# Altium footprint library Footprints_SOC.PcbLib: 201 footprints (part 6 of 13)
Each footprint in its own frame and in the unit in brackets; x right, y up, seen from the top. Pads: shape width x height; smd on the part's side, far side on the other; paste and mask are expansions set on the pad; w line width, h text height; cw(c..) or ccw(c..) is an arc to the next point about the centre after c.
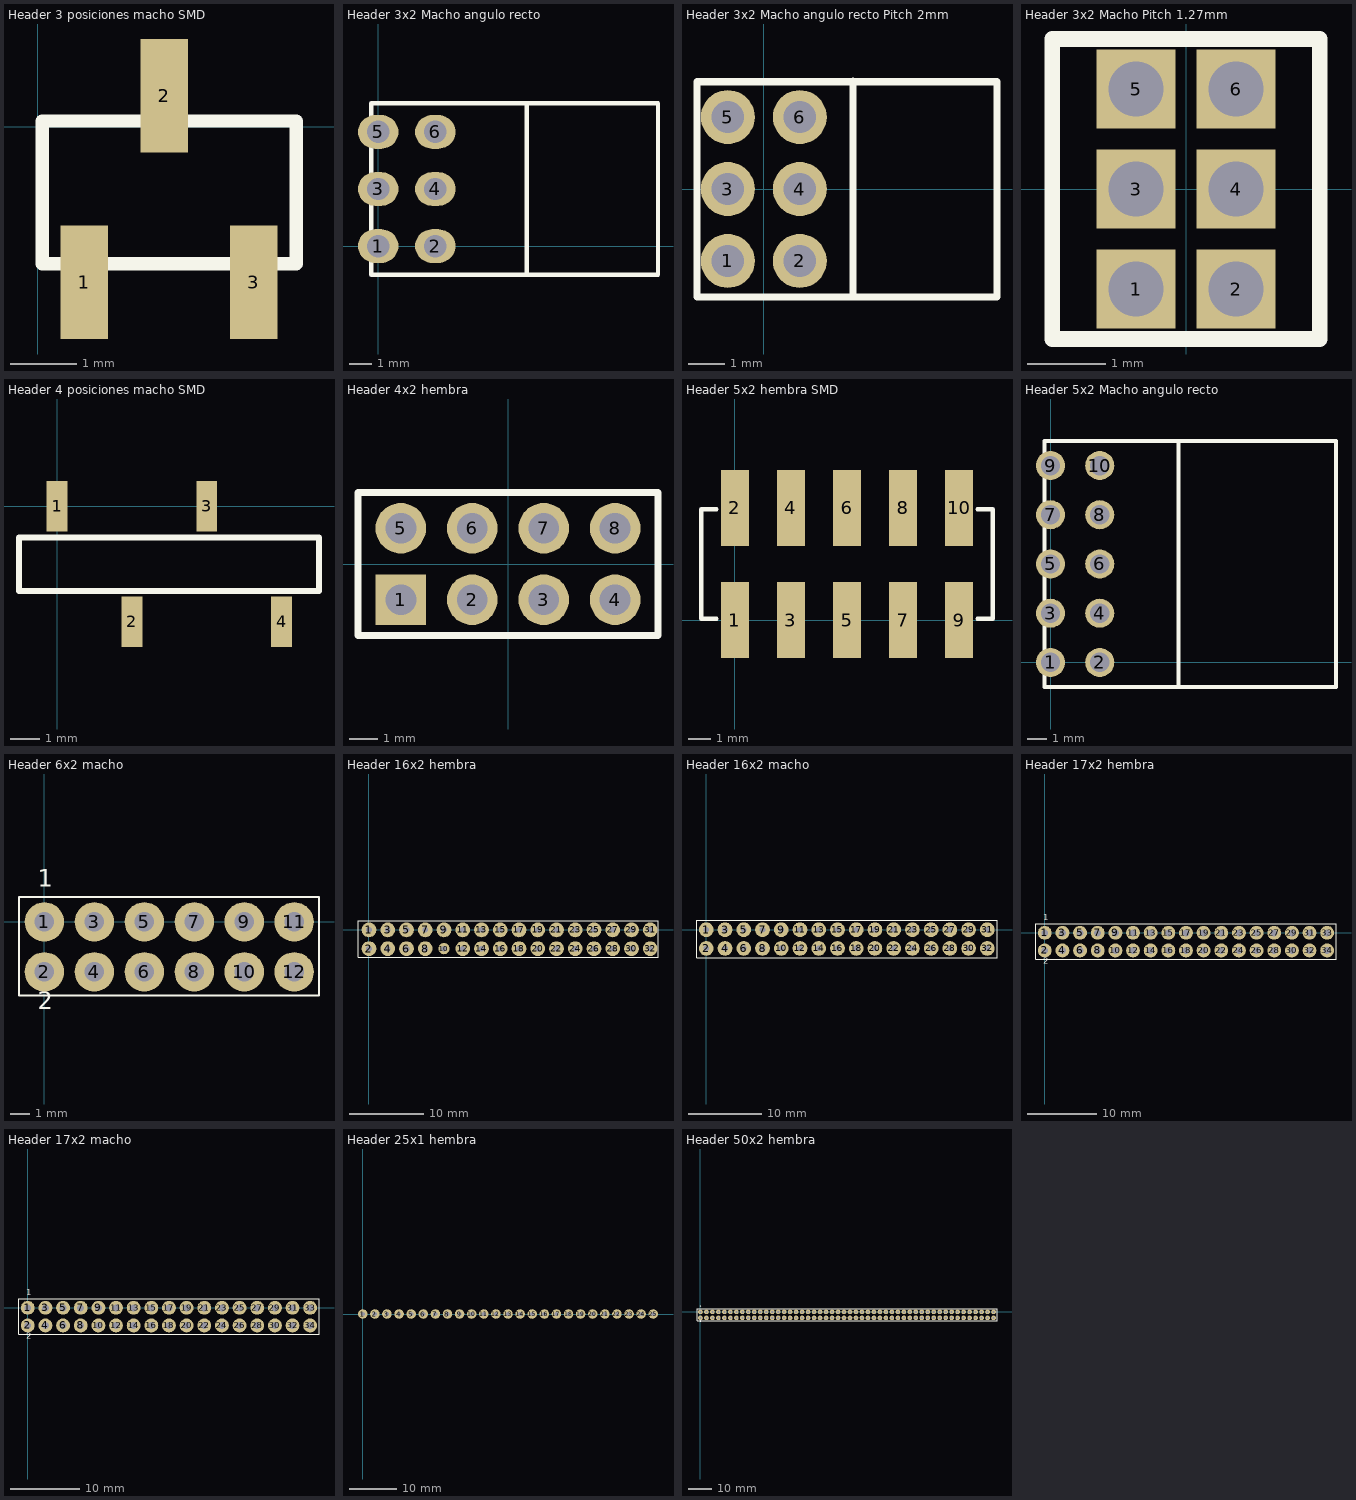
[diagram p5: the footprints below, top view; thin cyan lines are the x and y axes]

## Fibra Optica Panel [mm]
3D body: height 14.75, standoff 2.05, extent 0.833,0.49 11.833,11.487
3D body: height 4.1, standoff -2.05, extent 0.806,0.357 11.855,11.533
3D body: height -2.05, standoff -19.35, extent 0.838,0.533 11.838,11.533

## Header 3 posiciones macho SMD [mm] "Pitch 1.27mm"
pads (3):
  rect 0.71x1.7 smd: 1(0.7,-2.33) 2(1.9,0.47) 3(3.24,-2.33)
Top Overlay:
  lines w0.2: 0.07,-2.05 0.07,0.09 3.88,0.09 3.88,-2.05 0.07,-2.05

## Header 3x2 Macho angulo recto [mm] "P/N: TSW-103-08-F-D-RA"
pads (6):
  oval 1.8x1.5 hole 1: 1(0,0) 2(2.54,0) 3(0,2.54) 4(2.54,2.54) 5(0,5.08) 6(2.54,5.08)
Top Overlay:
  lines w0.2: 6.605,-1.27 6.605,6.35 ; -0.316,-1.27 12.447,-1.27 12.447,6.35 -0.316,6.35 -0.316,-1.27
3D body "Header 3x2 macho angulo recto (TSW-103-08-F-D-RA).stp": height 5.54, standoff -2.31, extent -0.316,-1.27 12.447,6.35

## Header 3x2 Macho angulo recto Pitch 2mm [mm] "P/N: 0877600616"
pads (6):
  round 1.5 hole 0.9: 1(-1,-2) 2(1,-2) 3(-1,0) 4(1,0) 5(-1,2) 6(1,2)
Top Overlay:
  lines w0.2: 2.48,-3 2.48,3 ; -1.856,-3 -1.856,2.98 6.48,2.98 6.48,-3 -1.856,-3
3D body "Header 3x2 angulo recto pitch 2mm (877600616).stp": height 5.15, standoff -1.75, extent -1.52,-3 6.48,3

## Header 3x2 Macho Pitch 1.27mm [mm] "P/N: GRPB032VWVN-RC"
pads (6):
  rect 1x1 hole 0.7: 1(-0.635,-1.27) 2(0.635,-1.27) 3(-0.635,0) 4(0.635,0) 5(-0.635,1.27) 6(0.635,1.27)
Top Overlay:
  lines w0.2: -1.7,-1.905 1.7,-1.905 1.7,1.905 -1.7,1.905 -1.7,-1.905
3D body "Header 3x2 macho pitch 1.27mm.step": height 4.05, standoff -2.25, extent -1.7,-1.905 1.7,1.905

## Header 4 posiciones macho SMD [mm] "Pitch 2.54mm"
pads (4):
  rect 0.71x1.7 smd: 1(0,0) 2(2.54,-3.92) 3(5.08,0) 4(7.62,-3.92)
Top Overlay:
  lines w0.2: -1.29,-2.87 -1.29,-1.06 8.89,-1.06 8.89,-2.87 -1.29,-2.87
3D body "Header 4 posiciones macho SMD.stp": height 8.38, standoff -1.27, extent -1.27,-4.603 8.89,0.68

## Header 4x2 hembra [mm] "Pitch 2.54mm"
pads (8):
  rect 1.8x1.8 hole 1.1: 1(-3.81,-1.27)
  round 1.8 hole 1.1: 2(-1.27,-1.27) 3(1.27,-1.27) 4(3.81,-1.27) 5(-3.81,1.27) 6(-1.27,1.27) 7(1.27,1.27) 8(3.81,1.27)
Top Overlay:
  lines w0.254: -5.33,-2.54 -5.33,2.54 5.33,2.54 5.33,-2.54 -5.33,-2.54
3D body "Header 4x2 hembra pitch 2.54mm .STEP": height 8.5, standoff -3.2, extent -5.33,-2.54 5.33,2.54

## Header 5x2 hembra SMD [mm] "Pitch 2.54mm P/N: SSW-105-22-G-D-VS"
pads (10):
  rect 1.27x3.43 smd: 1(0,0) 2(0,5.08) 3(2.54,0) 4(2.54,5.08) 5(5.08,0) 6(5.08,5.08) 7(7.62,0) 8(7.62,5.08) 9(10.16,0) 10(10.16,5.08)
Top Overlay:
  lines w0.2: -0.832,0.063 -1.524,0.063 -1.524,5.016 -0.832,5.016 ; 10.992,0.063 11.684,0.063 11.684,5.016 10.992,5.016
3D body "Header 5x2 hembra smd (SSW-105-22-G-D-VS).stp": height 9.51, standoff -0.27, extent -1.524,-1.397 11.684,6.477

## Header 5x2 Macho angulo recto [mm] "P/N: TSW-105-25-L-D-RA"
pads (10):
  round 1.5 hole 1: 1(0,0) 2(2.54,0) 3(0,2.54) 4(2.54,2.54) 5(0,5.08) 6(2.54,5.08) 7(0,7.62) 8(2.54,7.62) 9(0,10.16) 10(2.54,10.16)
Top Overlay:
  lines w0.2: 6.605,-1.27 6.605,11.43 ; -0.316,-1.27 -0.316,11.43 14.733,11.43 14.733,-1.27 -0.316,-1.27
3D body "header macho angulo recto 5x2 (TSW-105-25-L-D-RA).stp": height 5.54, standoff -2.56, extent -0.316,-1.27 14.733,11.43

## Header 6x2 macho [mm]
pads (12):
  round 2 hole 1: 1(0,0) 2(0,-2.54) 3(2.54,0) 4(2.54,-2.54) 5(5.08,0) 6(5.08,-2.54) 7(7.62,0) 8(7.62,-2.54) 9(10.16,0) 10(10.16,-2.54) 11(12.7,0) 12(12.7,-2.54)
Top Overlay:
  lines w0.1: -1.29,-3.74 -1.29,1.27 13.96,1.27 13.96,-3.74 -1.29,-3.74
  text "2" at -0.33,-4.75 h1.52
  text "1" at -0.33,1.48 h1.52
3D body "header 6x2 macho.stp": height 9.25, standoff -2.9, extent -1.28,-3.8 13.96,1.28

## Header 16x2 hembra [mm]
pads (32):
  round 2 hole 0.762: 1(0,0) 2(0,-2.54) 3(2.54,0) 4(2.54,-2.54) 5(5.08,0) 6(5.08,-2.54) 7(7.62,0) 8(7.62,-2.54) 9(10.16,0) 11(12.7,0) 12(12.7,-2.54) 13(15.24,0) 14(15.24,-2.54) 15(17.78,0) 16(17.78,-2.54) 17(20.32,0) 18(20.32,-2.54) 19(22.86,0) 20(22.86,-2.54) 21(25.4,0) 22(25.4,-2.54) 23(27.94,0) 24(27.94,-2.54) 25(30.48,0) 26(30.48,-2.54) 27(33.02,0) 28(33.02,-2.54) 29(35.56,0) 30(35.56,-2.54) 31(38.1,0) 32(38.1,-2.54)
  round 1.524 hole 0.762: 10(10.16,-2.54)
Top Overlay:
  lines w0.1: -1.49,-3.74 39.15,-3.74 39.15,1.27 -1.49,1.27 -1.49,-3.74
3D body "header 16x2 hembra .stp": height 9, standoff -2.56, extent -1.5,-3.74 39.14,1.289

## Header 16x2 macho [mm]
pads (32):
  round 2 hole 0.762: 1(0,0) 2(0,-2.54) 3(2.54,0) 4(2.54,-2.54) 5(5.08,0) 6(5.08,-2.54) 7(7.62,0) 8(7.62,-2.54) 9(10.16,0) 10(10.16,-2.54) 11(12.7,0) 12(12.7,-2.54) 13(15.24,0) 14(15.24,-2.54) 15(17.78,0) 16(17.78,-2.54) 17(20.32,0) 18(20.32,-2.54) 19(22.86,0) 20(22.86,-2.54) 21(25.4,0) 22(25.4,-2.54) 23(27.94,0) 24(27.94,-2.54) 25(30.48,0) 26(30.48,-2.54) 27(33.02,0) 28(33.02,-2.54) 29(35.56,0) 30(35.56,-2.54) 31(38.1,0) 32(38.1,-2.54)
Top Overlay:
  lines w0.1: -1.26,-3.8 -1.26,1.27 39.41,1.27 39.41,-3.8 -1.26,-3.8
3D body "header 16x2 macho.stp": height 4.93, standoff -2.69, extent -1.24,-3.785 39.4,1.245

## Header 17x2 hembra [mm]
pads (34):
  round 2 hole 1: 1(0,0) 2(0,-2.54) 3(2.54,0) 4(2.54,-2.54) 5(5.08,0) 6(5.08,-2.54) 7(7.62,0) 8(7.62,-2.54) 9(10.16,0) 10(10.16,-2.54) 11(12.7,0) 12(12.7,-2.54) 13(15.24,0) 14(15.24,-2.54) 15(17.78,0) 16(17.78,-2.54) 17(20.32,0) 18(20.32,-2.54) 19(22.86,0) 20(22.86,-2.54) 21(25.4,0) 22(25.4,-2.54) 23(27.94,0) 24(27.94,-2.54) 25(30.48,0) 26(30.48,-2.54) 27(33.02,0) 28(33.02,-2.54) 29(35.56,0) 30(35.56,-2.54) 31(38.1,0) 32(38.1,-2.54) 33(40.64,0) 34(40.64,-2.54)
Top Overlay:
  lines w0.1: -1.26,-3.8 -1.26,1.27 41.91,1.27 41.91,-3.8 -1.26,-3.8
  text "1" at -0.21,1.47 h1.52
  text "2" at -0.21,-4.78 h1.52
3D body "header 17x2 hembra.stp": height 11.01, standoff -2.33, extent -1.49,-3.79 42.198,1.29

## Header 17x2 macho [mm]
pads (34):
  round 2 hole 1: 1(0,0) 2(0,-2.54) 3(2.54,0) 4(2.54,-2.54) 5(5.08,0) 6(5.08,-2.54) 7(7.62,0) 8(7.62,-2.54) 9(10.16,0) 10(10.16,-2.54) 11(12.7,0) 12(12.7,-2.54) 13(15.24,0) 14(15.24,-2.54) 15(17.78,0) 16(17.78,-2.54) 17(20.32,0) 18(20.32,-2.54) 19(22.86,0) 20(22.86,-2.54) 21(25.4,0) 22(25.4,-2.54) 23(27.94,0) 24(27.94,-2.54) 25(30.48,0) 26(30.48,-2.54) 27(33.02,0) 28(33.02,-2.54) 29(35.56,0) 30(35.56,-2.54) 31(38.1,0) 32(38.1,-2.54) 33(40.64,0) 34(40.64,-2.54)
Top Overlay:
  lines w0.1: -1.26,-3.8 -1.26,1.27 41.91,1.27 41.91,-3.8 -1.26,-3.8
  text "1" at -0.21,1.47 h1.52
  text "2" at -0.21,-4.78 h1.52
3D body "header 17x2 macho.stp": height 18.29, standoff -2.79, extent -1.25,-3.79 41.93,1.29

## Header 25x1 hembra [mm] "Contact Length - Post 16.66mm. Insulation Height 5.85mm"
pads (25):
  round 2 hole 0.9: 1(0,0) 2(2.54,0) 3(5.08,0) 4(7.62,0) 5(10.16,0) 6(12.7,0) 7(15.24,0) 8(17.78,0) 9(20.32,0) 10(22.86,0) 11(25.4,0) 12(27.94,0) 13(30.48,0) 14(33.02,0) 15(35.56,0) 16(38.1,0) 17(40.64,0) 18(43.18,0) 19(45.72,0) 20(48.26,0) 21(50.8,0) 22(53.34,0) 23(55.88,0) 24(58.42,0) 25(60.96,0)
3D body "header hembra 25x1 pines largos.stp": height 5.85, standoff -16.65, extent -1.27,-1.27 62.23,1.27

## Header 50x2 hembra [mm]
pads (100):
  round 2 hole 0.9: 1(0,0) 2(0,-2.54) 3(2.54,0) 4(2.54,-2.54) 5(5.08,0) 6(5.08,-2.54) 7(7.62,0) 8(7.62,-2.54) 9(10.16,0) 10(10.16,-2.54) 11(12.7,0) 12(12.7,-2.54) 13(15.24,0) 14(15.24,-2.54) 15(17.78,0) 16(17.78,-2.54) 17(20.32,0) 18(20.32,-2.54) 19(22.86,0) 20(22.86,-2.54) 21(25.4,0) 22(25.4,-2.54) 23(27.94,0) 24(27.94,-2.54) 25(30.48,0) 26(30.48,-2.54) 27(33.02,0) 28(33.02,-2.54) 29(35.56,0) 30(35.56,-2.54) 31(38.1,0) 32(38.1,-2.54) 33(40.64,0) 34(40.64,-2.54) 35(43.18,0) 36(43.18,-2.54) 37(45.72,0) 38(45.72,-2.54) 39(48.26,0) 40(48.26,-2.54) 41(50.8,0) 42(50.8,-2.54) 43(53.34,0) 44(53.34,-2.54) 45(55.88,0) 46(55.88,-2.54) 47(58.42,0) 48(58.42,-2.54) 49(60.96,0) 50(60.96,-2.54) 51(63.5,0) 52(63.5,-2.54) 53(66.04,0) 54(66.04,-2.54) 55(68.58,0) 56(68.58,-2.54) 57(71.12,0) 58(71.12,-2.54) 59(73.66,0) 60(73.66,-2.54) 61(76.2,0) 62(76.2,-2.54) 63(78.74,0) 64(78.74,-2.54) 65(81.28,0) 66(81.28,-2.54) 67(83.82,0) 68(83.82,-2.54) 69(86.36,0) 70(86.36,-2.54) 71(88.9,0) 72(88.9,-2.54) 73(91.44,0) 74(91.44,-2.54) 75(93.98,0) 76(93.98,-2.54) 77(96.52,0) 78(96.52,-2.54) 79(99.06,0) 80(99.06,-2.54) 81(101.6,0) 82(101.6,-2.54) 83(104.14,0) 84(104.14,-2.54) 85(106.68,0) 86(106.68,-2.54) 87(109.22,0) 88(109.22,-2.54) 89(111.76,0) 90(111.76,-2.54) 91(114.3,0) 92(114.3,-2.54) 93(116.84,0) 94(116.84,-2.54) 95(119.38,0) 96(119.38,-2.54) 97(121.92,0) 98(121.92,-2.54) 99(124.46,0) 100(124.46,-2.54)
Top Overlay:
  lines w0.1: 125.92,1.265 125.92,-3.74 -1.46,-3.74 -1.46,1.27 125.92,1.27
  text "2" at -0.37,-4.79 h1.52
  text "1" at -0.37,1.45 h1.52
3D body "header 50x2 hembra.stp": height 8.51, standoff -2.64, extent -1.46,-3.673 126.048,1.28